# Altium footprint library MyLib.PcbLib: 575 footprints (part 36 of 36)
Each footprint in its own frame and in the unit in brackets; x right, y up, seen from the top. Pads: shape width x height; smd on the part's side, far side on the other; paste and mask are expansions set on the pad; w line width, h text height; cw(c..) or ccw(c..) is an arc to the next point about the centre after c.
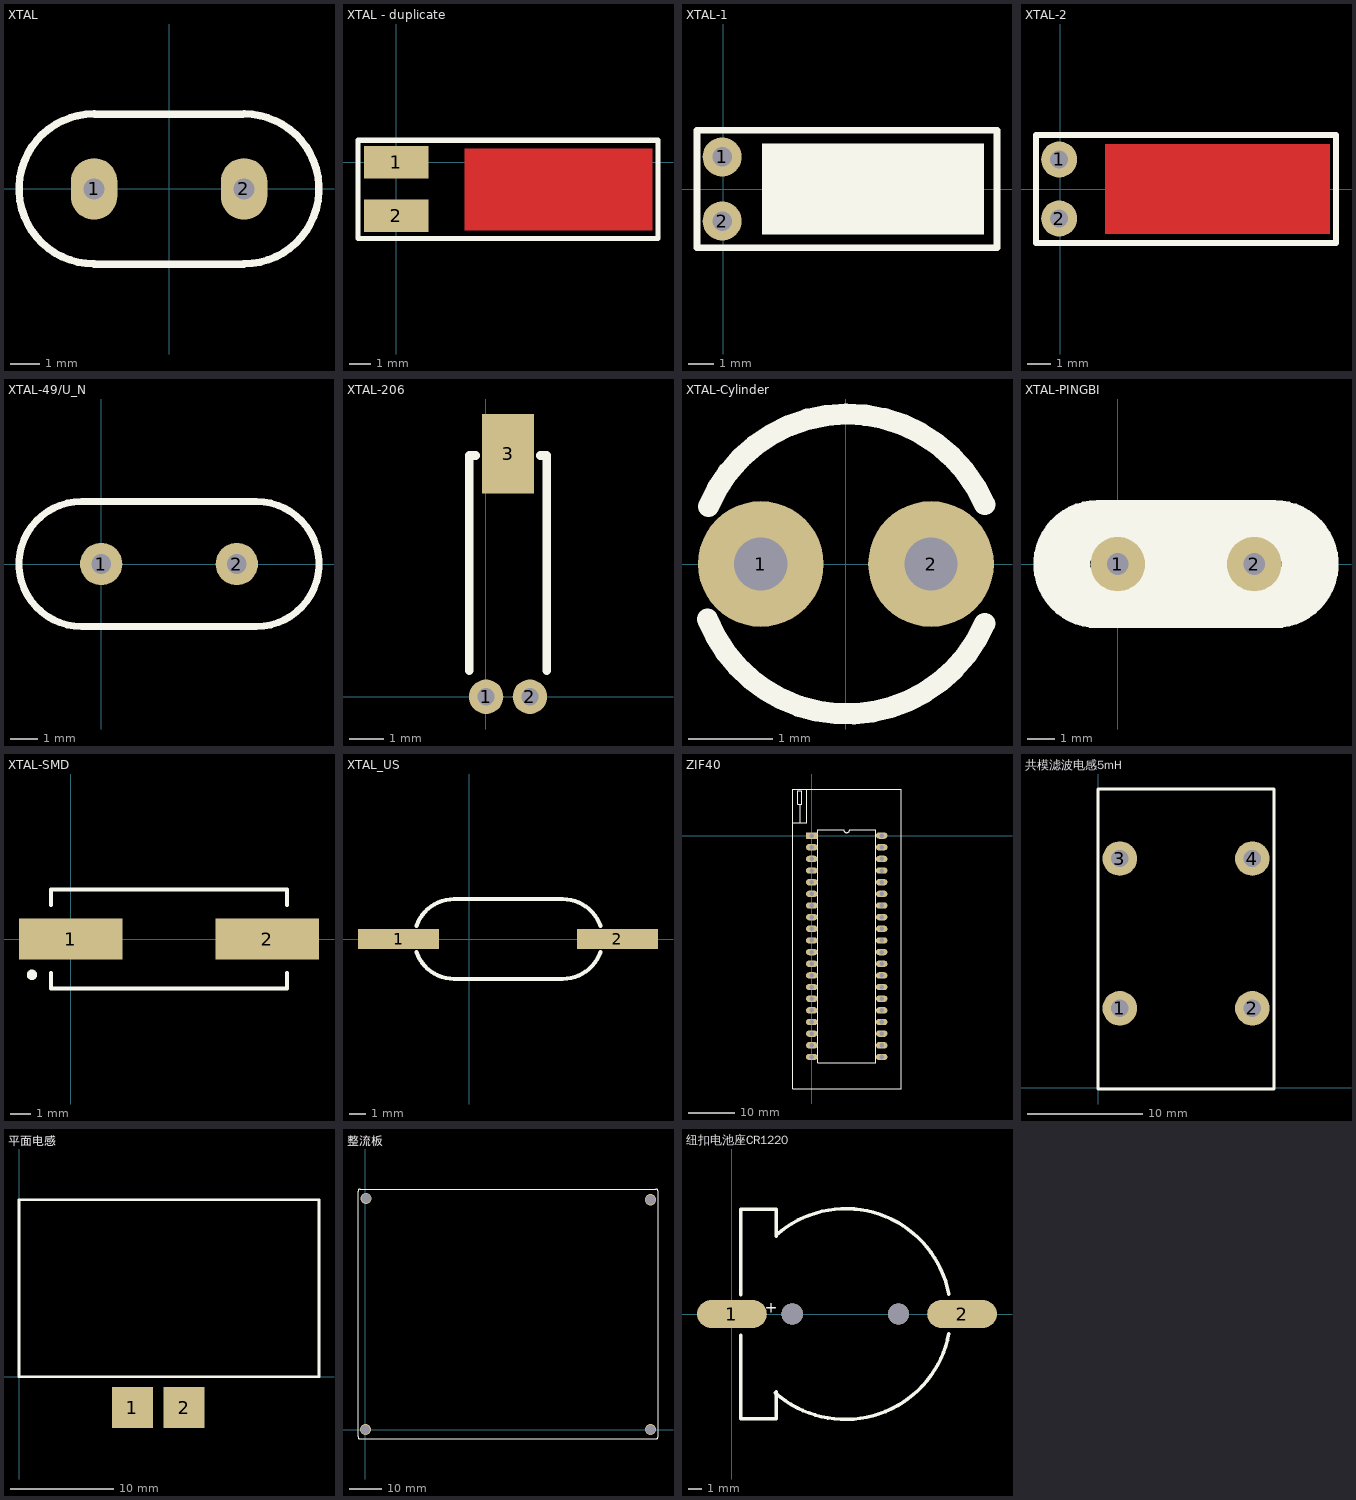
[diagram p35: the footprints below, top view; thin cyan lines are the x and y axes]

## XTAL [mil]
pads (2):
  oval 62x82 hole 28: 1(-100,0) 2(100,0)
Top Overlay:
  lines w10: -100,-100.39 99.8,-100.39 ; -100,-100 cw(c-100,0) -100,100 ; -99.02,99.41 98.62,99.37 ; 100,-100 ccw(c100,0) 100,100
3D body: height 121.8, standoff -100, extent -200,-60 220,60

## XTAL - duplicate [mm] "卧式安装"
height 3
pads (2):
  rect 3x1.5 smd: 1(0,0) 2(0,-2.5)
Top Layer:
  rectangle: 3.175,-3.175 11.938,0.635
Top Overlay:
  lines w0.254: -1.778,-3.556 -1.778,1.016 12.192,1.016 12.192,-3.556 -1.778,-3.556
3D body "xtal.STEP": height 3, standoff 0, extent -1.216,-2.75 10.516,0.25

## XTAL-1 [mil] "卧式安装"
height 118.11
pads (2):
  round 60 hole 30: 1(-1.42,49.21) 2(-1.42,-49.21)
Top Overlay:
  rectangle: 60,-70 400,70
  lines w10: -40,-90 420,-90 420,90 -40,90 -40,-90
3D body "xtal.STEP": height 118.11, standoff -78.74, extent -11.25,-59.05 372.61,59.06

## XTAL-2 [mil] "卧式安装"
height 118.11
pads (2):
  round 60 hole 30: 1(-1.42,49.21) 2(-1.42,-49.21)
Top Layer:
  rectangle: 75,-75 450,75
Top Overlay:
  lines w10: -40,-90 460,-90 460,90 -40,90 -40,-90
3D body "xtal.STEP": height 118.11, standoff -78.74, extent -10,-59.06 373.86,59.06

## XTAL-49/U_N [mil] "高型晶振（未加焊）"
pads (2):
  round 60 hole 28: 1(0,0) 2(192,0)
Top Overlay:
  lines w10: -28,-88.5 cw(c-28,0) -28,88.5 220,88.5 cw(c220,0) 220,-88.5 -28,-88.5
3D body: height 511.81, standoff -118.11, extent -116.54,-88.39 308.66,88.78

## XTAL-206 [mm]
pads (3):
  round 1 hole 0.5: 1(0.004,0) 2(1.276,0)
  rect 1.5x2.3 smd: 3(0.64,7.054)
Top Overlay:
  lines w0.254: -0.487,0.762 -0.487,7 -0.3,7 ; 1.58,7 1.767,7 1.767,0.762

## XTAL-Cylinder [mm] "柱式晶振"
height 8
pads (2):
  round 1.5 hole 0.635: 1(-1.016,0) 2(1.016,0)
Top Overlay:
  lines w0.254: -1.652,-0.659 ccw(c0.013,0) 1.657,-0.71 ; -1.642,0.685 cw(c0.013,0) 1.657,0.71
3D body "Pin.STEP": height 3, standoff -2, extent 0.27,-0.746 1.762,0.746
3D body: height 9, standoff 0.3, extent -1.485,-1.498 1.511,1.498
3D body "Pin.STEP": height 3, standoff -2, extent -1.762,-0.746 -0.27,0.746

## XTAL-PINGBI [mm]
pads (2):
  round 2 hole 0.8: 1(0,0) 2(5,0)
Top Overlay:
  circle w1.2: c-0.753,0 r1.653
  circle w1.2: c5.747,0 r1.653
  rectangle: -0.75,-2.243 5.75,2.257
  lines w0.2: -0.75,-2.25 cw(c-0.75,0) -0.75,2.25 5.75,2.25 cw(c5.75,0) 5.75,-2.25 -0.75,-2.25
  lines w0.254: 5.337,1.229 cw(c5,0) 5.35,1.225
  lines w1: -0.743,0.8 ccw(c-0.725,0) -0.725,-0.8 ; 5.707,0.8 cw(c5.707,0) 5.725,-0.8
3D body: height 3.5, standoff -3, extent -2.95,-2.255 7.85,2.245

## XTAL-SMD [mm]
pads (2):
  rect 5x2 smd: 1(0,0) 2(9.5,0)
Top Overlay:
  circle w0.25: c-1.875,-1.73 r0.125
  lines w0.2: -0.95,-1.65 -0.95,-2.4 10.45,-2.4 10.45,-1.65 ; -0.95,1.65 -0.95,2.4 10.45,2.4 10.45,1.65
3D body "User Library-hc49_cystal.STEP": height 4, standoff 0, extent -1.95,-2.462 11.45,2.438

## XTAL_US [mil]
pads (2):
  rect 200x50 smd: 1(-175,0) 2(365,0)
Top Overlay:
  lines w10: -130.92,-31.85 ccw(c-37.79,0) -37.79,-98.42 ; -130.92,31.85 cw(c-37.79,0) -37.79,98.43 ; -38,98.42 229.92,98.43 cw(c229.92,0) 323.05,31.85 ; -37.8,-98.43 229.92,-98.42 ccw(c229.92,0) 323.05,-31.85

## ZIF40 [mm]
pads (40):
  rect 2.5x1.38 hole 1: 1(0,0)
  oval 2.5x1.38 hole 1: 2(0,-2.54) 3(0,-5.08) 4(0,-7.62) 5(0,-10.16) 6(0,-12.7) 7(0,-15.24) 8(0,-17.78) 9(0,-20.32) 10(0,-22.86) 11(0,-25.4) 12(0,-27.94) 13(0,-30.48) 14(0,-33.02) 15(0,-35.56) 16(0,-38.1) 17(0,-40.64) 18(0,-43.18) 19(0,-45.72) 20(0,-48.26) 21(15.24,-48.26) 22(15.24,-45.72) 23(15.24,-43.18) 24(15.24,-40.64) 25(15.24,-38.1) 26(15.24,-35.56) 27(15.24,-33.02) 28(15.24,-30.48) 29(15.24,-27.94) 30(15.24,-25.4) 31(15.24,-22.86) 32(15.24,-20.32) 33(15.24,-17.78) 34(15.24,-15.24) 35(15.24,-12.7) 36(15.24,-10.16) 37(15.24,-7.62) 38(15.24,-5.08) 39(15.24,-2.54) 40(15.24,0)
Top Overlay:
  lines w0.254: -4.191,0 -4.191,10.16 19.558,10.16 19.558,0 19.558,-55.245 -1.397,-55.245 ; -4.191,0.762 -4.191,-55.245 -1.27,-55.245 ; -4.064,2.794 -1.143,2.794 -1.143,4.953 -1.143,10.16 ; -2.54,2.794 -2.54,6.858 ; -2.159,6.985 -2.159,6.858 ; -2.159,6.858 -3.048,6.858 -3.048,9.779 -2.159,9.779 -2.159,6.858 ; 1.27,-49.53 13.97,-49.53 13.97,1.27 8.255,1.27 cw(c7.62,1.27) 6.985,1.27 1.27,1.27 1.27,-49.53
3D body "ZIF-40.STEP": height 11, standoff -5, extent -4.699,-54.598 19.167,22.594

## 共模滤波电感5mH [mm]
pads (4):
  round 3 hole 1.5: 1(1.881,6.873) 2(13.381,6.873) 3(1.881,19.873) 4(13.381,19.873)
Top Overlay:
  lines w0.254: 0,-0.127 0,25.908 15.24,25.908 15.24,18.51 15.24,7.271 15.24,-0.127 0,-0.127

## 平面电感 [mm]
pads (2):
  rect 4x4 smd: 1(11,-3) 2(16,-3)
Top Overlay:
  lines w0.254: 0,17 0,0 29,0 ; 0,17.145 29.083,17.145 29.083,0

## 整流板 [mm]
via 88.697,71.552 diameter 3.5 hole 3
via 0.203,71.933 diameter 3.5 hole 3
via 88.697,0 diameter 3.5 hole 3
via 0,0 diameter 3.5 hole 3
Top Overlay:
  lines w0.254: -1.727,-2.896 90.399,-2.896 ccw(c90.399,-2.261) 91.034,-2.261 91.034,74.193 ccw(c90.399,74.193) 90.399,74.828 -1.676,74.828 ccw(c-1.676,74.193) -2.311,74.193 -2.311,-2.261 ccw(c-1.676,-2.261) -1.676,-2.896

## 纽扣电池座CR1220 [mm] "小的"
height 5
pads (2):
  oval 5x2 smd: 1(0,0) 2(16.5,0)
via 4.318,0 diameter 1.524 hole 1.524
via 11.938,0 diameter 1.524 hole 1.524
Top Overlay:
  lines w0.254: 0.635,-1.524 0.635,-7.493 3.175,-7.493 3.175,-5.588 ; 0.635,1.397 0.635,7.493 3.175,7.493 3.175,5.588 ; 3.115,-5.655 ccw(c8.128,0) 15.553,-1.408 ; 3.175,5.659 cw(c8.159,0.035) 15.543,1.43
  text "+" at 3.302,0.762 h0.81
3D body "User Library-cr1220.STEP": height 3.94, standoff -1, extent -1,-7.5 17.5,7.497